# Altium footprint library Library.PcbLib: 224 footprints (part 1 of 16)
Each footprint in its own frame and in the unit in brackets; x right, y up, seen from the top. Pads: shape width x height; smd on the part's side, far side on the other; paste and mask are expansions set on the pad; w line width, h text height; cw(c..) or ccw(c..) is an arc to the next point about the centre after c.
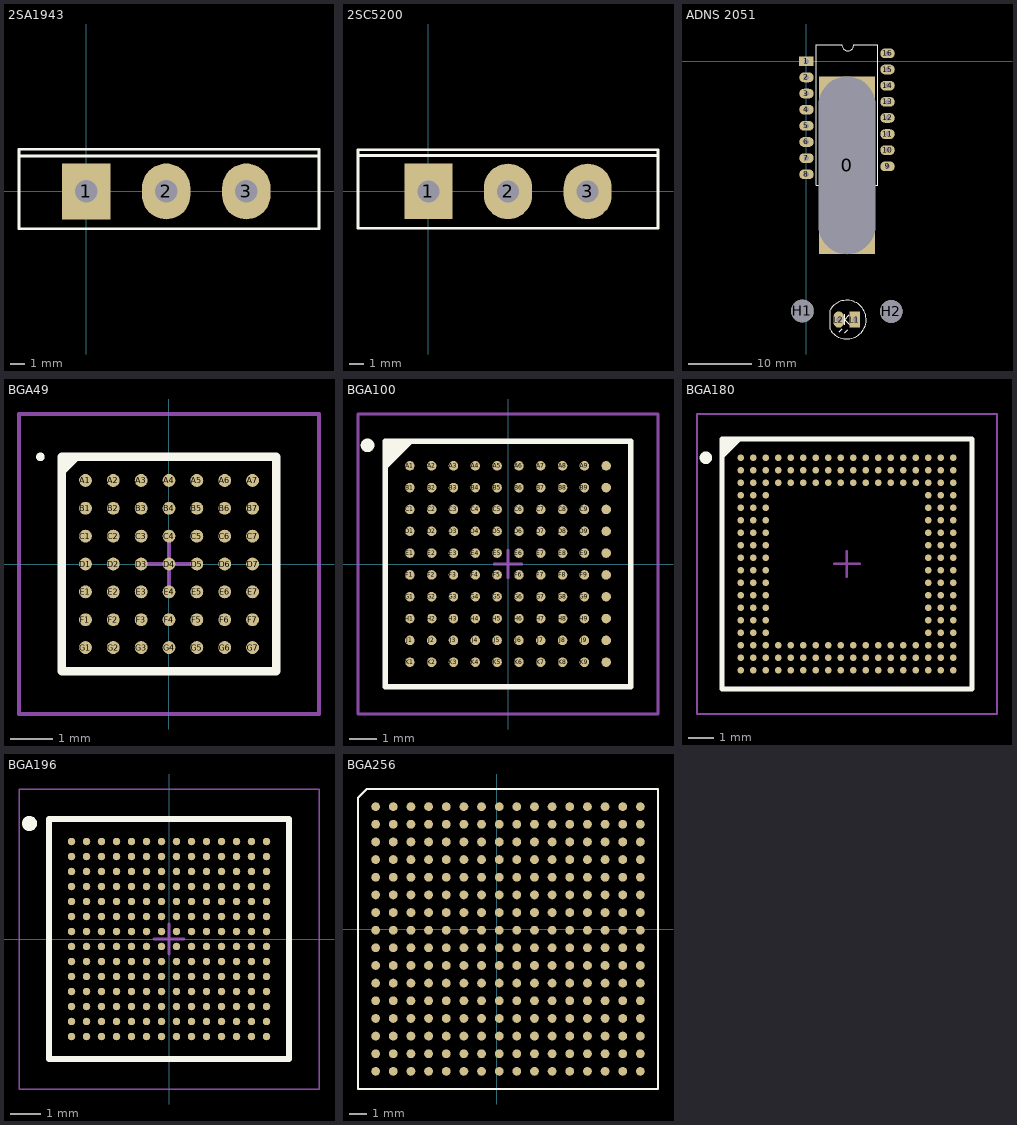
[diagram p0: the footprints below, top view; thin cyan lines are the x and y axes]

## 2SA1943 [mil] "2SA1943"
height 200
pads (3):
  rect 130x150 hole 60: 1(0,0)
  oval 130x150 hole 60: 2(215,0) 3(430,0)
Top Overlay:
  lines w7: -175,95 625,95 ; -180,-100 -180,113 625,113 625,-100 -180,-100
3D body "User Library-2SA1943.step": height 1485.22, standoff -324.98, extent -183.54,-95 623.54,109.72

## 2SC5200 [mil] "2SC5200"
height 200
pads (3):
  rect 130x150 hole 60: 1(0,0)
  oval 130x150 hole 60: 2(215,0) 3(430,0)
Top Overlay:
  lines w7: -190,97 620,97 ; -190,-100 -190,113 620,113 620,-100 -190,-100
3D body "User Library-2SC5200.step": height 1485.22, standoff -324.98, extent -188.54,-94.72 618.54,110

## ADNS 2051 [mil] "Foots pin for Mouse"
pads (21):
  rect 350x1100 hole 350 slot 1100 at 90 deg: 0(251,-645)
  rect 90x60 hole 31: 1(0,0)
  oval 90x60 hole 31: 2(0,-100) 3(0,-200) 4(0,-300) 5(0,-400) 6(0,-500) 7(0,-600) 8(0,-700) 9(502,-651) 10(502,-551) 11(502,-451) 12(502,-351) 13(502,-251) 14(502,-151) 15(502,-51) 16(502,49)
  round 140 hole 140: H1(-25,-1547) H2(525,-1550)
  rect 65x100 hole 32: L1(300,-1600.5)
  oval 65x100 hole 32: L2(200,-1600.5)
Top Overlay:
  lines w7: 146,-1660.5 146,-1541.5 ; 146.06,-1540.53 cw(c250,-1600.5) 146.49,-1661.21 ; 204,-1675.5 221,-1658.5 ; 218,103 59,103 59,-767 443,-767 443,103 296,103 ; 218.97,101 ccw(c255.99,101) 293,101 ; 236,-1632.5 236,-1566.5 ; 238,-1681.5 255,-1664.5 ; 265,-1629.5 236,-1600.5 265,-1571.5 ; 394.94,-516.95 ccw(c252.8,-525.96) 395,-518
  text "ADNS2051" at 108,-229 h40

## BGA49 [mm] "BGA, 49-Leads, Body 5x5mm, Pitch 0.65mm"
height 1
pads (49):
  round 0.3 smd: A1(-1.95,1.95) A2(-1.3,1.95) A3(-0.65,1.95) A4(0,1.95) A5(0.65,1.95) A6(1.3,1.95) A7(1.95,1.95) B1(-1.95,1.3) B2(-1.3,1.3) B3(-0.65,1.3) B4(0,1.3) B5(0.65,1.3) B6(1.3,1.3) B7(1.95,1.3) C1(-1.95,0.65) C2(-1.3,0.65) C3(-0.65,0.65) C4(0,0.65) C5(0.65,0.65) C6(1.3,0.65) C7(1.95,0.65) D1(-1.95,0) D2(-1.3,0) D3(-0.65,0) D4(0,0) D5(0.65,0) D6(1.3,0) D7(1.95,0) E1(-1.95,-0.65) E2(-1.3,-0.65) E3(-0.65,-0.65) E4(0,-0.65) E5(0.65,-0.65) E6(1.3,-0.65) E7(1.95,-0.65) F1(-1.95,-1.3) F2(-1.3,-1.3) F3(-0.65,-1.3) F4(0,-1.3) F5(0.65,-1.3) F6(1.3,-1.3) F7(1.95,-1.3) G1(-1.95,-1.95) G2(-1.3,-1.95) G3(-0.65,-1.95) G4(0,-1.95) G5(0.65,-1.95) G6(1.3,-1.95) G7(1.95,-1.95)
Top Overlay:
  circle w0.1: c-3,2.5 r0.05
  region: -2.178,2.5 -2.5,2.178 -2.5,2.5
  lines w0.2: -2.5,2.178 -2.178,2.5 ; -2.5,-2.5 2.5,-2.5 2.5,2.5 -2.5,2.5 -2.5,-2.5
Mechanical 13:
  lines w0.1: -2.5,-2.5 2.5,-2.5 2.5,2.5 -2.5,2.5 -2.5,-2.5
Mechanical 15:
  lines w0.1: -0.5,0 0.5,0 ; 0,-0.5 0,0.5 ; -3.5,-3.5 3.5,-3.5 3.5,3.5 -3.5,3.5 -3.5,-3.5
3D body "User Library-VFBGA-49.step": height 1, standoff 0.03, extent -2.5,-2.5 2.5,2.5

## BGA100 [mm] "BGA, 100-Leads, Body 9x9mm, Pitch 0.8mm"
height 1.2
pads (100):
  round 0.35 smd: A1(-3.6,3.6) A2(-2.8,3.6) A3(-2,3.6) A4(-1.2,3.6) A5(-0.4,3.6) A6(0.4,3.6) A7(1.2,3.6) A8(2,3.6) A9(2.8,3.6) A10(3.6,3.6) B1(-3.6,2.8) B2(-2.8,2.8) B3(-2,2.8) B4(-1.2,2.8) B5(-0.4,2.8) B6(0.4,2.8) B7(1.2,2.8) B8(2,2.8) B9(2.8,2.8) B10(3.6,2.8) C1(-3.6,2) C2(-2.8,2) C3(-2,2) C4(-1.2,2) C5(-0.4,2) C6(0.4,2) C7(1.2,2) C8(2,2) C9(2.8,2) C10(3.6,2) D1(-3.6,1.2) D2(-2.8,1.2) D3(-2,1.2) D4(-1.2,1.2) D5(-0.4,1.2) D6(0.4,1.2) D7(1.2,1.2) D8(2,1.2) D9(2.8,1.2) D10(3.6,1.2) E1(-3.6,0.4) E2(-2.8,0.4) E3(-2,0.4) E4(-1.2,0.4) E5(-0.4,0.4) E6(0.4,0.4) E7(1.2,0.4) E8(2,0.4) E9(2.8,0.4) E10(3.6,0.4) F1(-3.6,-0.4) F2(-2.8,-0.4) F3(-2,-0.4) F4(-1.2,-0.4) F5(-0.4,-0.4) F6(0.4,-0.4) F7(1.2,-0.4) F8(2,-0.4) F9(2.8,-0.4) F10(3.6,-0.4) G1(-3.6,-1.2) G2(-2.8,-1.2) G3(-2,-1.2) G4(-1.2,-1.2) G5(-0.4,-1.2) G6(0.4,-1.2) G7(1.2,-1.2) G8(2,-1.2) G9(2.8,-1.2) G10(3.6,-1.2) H1(-3.6,-2) H2(-2.8,-2) H3(-2,-2) H4(-1.2,-2) H5(-0.4,-2) H6(0.4,-2) H7(1.2,-2) H8(2,-2) H9(2.8,-2) H10(3.6,-2) J1(-3.6,-2.8) J2(-2.8,-2.8) J3(-2,-2.8) J4(-1.2,-2.8) J5(-0.4,-2.8) J6(0.4,-2.8) J7(1.2,-2.8) J8(2,-2.8) J9(2.8,-2.8) J10(3.6,-2.8) K1(-3.6,-3.6) K2(-2.8,-3.6) K3(-2,-3.6) K4(-1.2,-3.6) K5(-0.4,-3.6) K6(0.4,-3.6) K7(1.2,-3.6) K8(2,-3.6) K9(2.8,-3.6) K10(3.6,-3.6)
Top Overlay:
  circle w0.25: c-5.15,4.35 r0.125
  region: -3.584,4.5 -4.5,3.584 -4.5,4.5
  lines w0.2: -4.5,3.584 -3.584,4.5 ; -4.5,-4.5 4.5,-4.5 4.5,4.5 -4.5,4.5 -4.5,-4.5
Mechanical 13:
  lines w0.1: -4.5,-4.5 4.5,-4.5 4.5,4.5 -4.5,4.5 -4.5,-4.5
Mechanical 15:
  lines w0.1: -0.5,0 0.5,0 ; 0,-0.5 0,0.5 ; -5.5,-5.5 5.5,-5.5 5.5,5.5 -5.5,5.5 -5.5,-5.5
3D body "BGA100C80P10X10_900X900X150.step": height 1.5, standoff 0, extent -4.5,-4.5 4.5,4.5

## BGA180 [mm] "BGA, 180-Leads, Body 10x10mm, Pitch 0.5mm"
height 1.11
pads (180):
  round 0.267 smd paste+0.038 mask+0.038: A1(-17,17) A2(-16.5,17) A3(-16,17) A4(-15.5,17) A5(-15,17) A6(-14.5,17) A7(-14,17) A8(-13.5,17) A9(-13,17) A10(-12.5,17) A11(-12,17) A12(-11.5,17) A13(-11,17) A14(-10.5,17) A15(-10,17) A16(-9.5,17) A17(-9,17) A18(-8.5,17) B1(-17,16.5) B2(-16.5,16.5) B3(-16,16.5) B4(-15.5,16.5) B5(-15,16.5) B6(-14.5,16.5) B7(-14,16.5) B8(-13.5,16.5) B9(-13,16.5) B10(-12.5,16.5) B11(-12,16.5) B12(-11.5,16.5) B13(-11,16.5) B14(-10.5,16.5) B15(-10,16.5) B16(-9.5,16.5) B17(-9,16.5) B18(-8.5,16.5) C1(-17,16) C2(-16.5,16) C3(-16,16) C4(-15.5,16) C5(-15,16) C6(-14.5,16) C7(-14,16) C8(-13.5,16) C9(-13,16) C10(-12.5,16) C11(-12,16) C12(-11.5,16) C13(-11,16) C14(-10.5,16) C15(-10,16) C16(-9.5,16) C17(-9,16) C18(-8.5,16) D1(-17,15.5) D2(-16.5,15.5) D3(-16,15.5) D16(-9.5,15.5) D17(-9,15.5) D18(-8.5,15.5) E1(-17,15) E2(-16.5,15) E3(-16,15) E16(-9.5,15) E17(-9,15) E18(-8.5,15) F1(-17,14.5) F2(-16.5,14.5) F3(-16,14.5) F16(-9.5,14.5) F17(-9,14.5) F18(-8.5,14.5) G1(-17,14) G2(-16.5,14) G3(-16,14) G16(-9.5,14) G17(-9,14) G18(-8.5,14) H1(-17,13.5) H2(-16.5,13.5) H3(-16,13.5) H16(-9.5,13.5) H17(-9,13.5) H18(-8.5,13.5) J1(-17,13) J2(-16.5,13) J3(-16,13) J16(-9.5,13) J17(-9,13) J18(-8.5,13) K1(-17,12.5) K2(-16.5,12.5) K3(-16,12.5) K16(-9.5,12.5) K17(-9,12.5) K18(-8.5,12.5) L1(-17,12) L2(-16.5,12) L3(-16,12) L16(-9.5,12) L17(-9,12) L18(-8.5,12) M1(-17,11.5) M2(-16.5,11.5) M3(-16,11.5) M16(-9.5,11.5) M17(-9,11.5) M18(-8.5,11.5) N1(-17,11) N2(-16.5,11) N3(-16,11) N16(-9.5,11) N17(-9,11) N18(-8.5,11) P1(-17,10.5) P2(-16.5,10.5) P3(-16,10.5) P16(-9.5,10.5) P17(-9,10.5) P18(-8.5,10.5) R1(-17,10) R2(-16.5,10) R3(-16,10) R16(-9.5,10) R17(-9,10) R18(-8.5,10) T1(-17,9.5) T2(-16.5,9.5) T3(-16,9.5) T4(-15.5,9.5) T5(-15,9.5) T6(-14.5,9.5) T7(-14,9.5) T8(-13.5,9.5) T9(-13,9.5) T10(-12.5,9.5) T11(-12,9.5) T12(-11.5,9.5) T13(-11,9.5) T14(-10.5,9.5) T15(-10,9.5) T16(-9.5,9.5) T17(-9,9.5) T18(-8.5,9.5) U1(-17,9) U2(-16.5,9) U3(-16,9) U4(-15.5,9) U5(-15,9) U6(-14.5,9) U7(-14,9) U8(-13.5,9) U9(-13,9) U10(-12.5,9) U11(-12,9) U12(-11.5,9) U13(-11,9) U14(-10.5,9) U15(-10,9) U16(-9.5,9) U17(-9,9) U18(-8.5,9) V1(-17,8.5) V2(-16.5,8.5) V3(-16,8.5) V4(-15.5,8.5) V5(-15,8.5) V6(-14.5,8.5) V7(-14,8.5) V8(-13.5,8.5) V9(-13,8.5) V10(-12.5,8.5) V11(-12,8.5) V12(-11.5,8.5) V13(-11,8.5) V14(-10.5,8.5) V15(-10,8.5) V16(-9.5,8.5) V17(-9,8.5) V18(-8.5,8.5)
Top Overlay:
  circle w0.25: c-18.4,17 r0.125
  region: -17.056,17.75 -17.75,17.056 -17.75,17.75
  lines w0.2: -17.75,17.056 -17.056,17.75 ; -17.75,7.75 -7.75,7.75 -7.75,17.75 -17.75,17.75 -17.75,7.75
Mechanical 13:
  lines w0.1: -17.75,7.75 -7.75,7.75 -7.75,17.75 -17.75,17.75 -17.75,7.75
Mechanical 15:
  lines w0.1: -13.25,12.75 -12.25,12.75 ; -12.75,12.25 -12.75,13.25 ; -18.75,6.75 -6.75,6.75 -6.75,18.75 -18.75,18.75 -18.75,6.75
3D body: height 0.51, standoff 0, extent -17.793,7.734 -7.734,17.793

## BGA196 [mm] "BGA, 196-Leads, Body 8x8mm, Pitch 0.5mm"
height 1.1
pads (196):
  round 0.25 smd: A1(-3.25,3.25) A2(-2.75,3.25) A3(-2.25,3.25) A4(-1.75,3.25) A5(-1.25,3.25) A6(-0.75,3.25) A7(-0.25,3.25) A8(0.25,3.25) A9(0.75,3.25) A10(1.25,3.25) A11(1.75,3.25) A12(2.25,3.25) A13(2.75,3.25) A14(3.25,3.25) B1(-3.25,2.75) B2(-2.75,2.75) B3(-2.25,2.75) B4(-1.75,2.75) B5(-1.25,2.75) B6(-0.75,2.75) B7(-0.25,2.75) B8(0.25,2.75) B9(0.75,2.75) B10(1.25,2.75) B11(1.75,2.75) B12(2.25,2.75) B13(2.75,2.75) B14(3.25,2.75) C1(-3.25,2.25) C2(-2.75,2.25) C3(-2.25,2.25) C4(-1.75,2.25) C5(-1.25,2.25) C6(-0.75,2.25) C7(-0.25,2.25) C8(0.25,2.25) C9(0.75,2.25) C10(1.25,2.25) C11(1.75,2.25) C12(2.25,2.25) C13(2.75,2.25) C14(3.25,2.25) D1(-3.25,1.75) D2(-2.75,1.75) D3(-2.25,1.75) D4(-1.75,1.75) D5(-1.25,1.75) D6(-0.75,1.75) D7(-0.25,1.75) D8(0.25,1.75) D9(0.75,1.75) D10(1.25,1.75) D11(1.75,1.75) D12(2.25,1.75) D13(2.75,1.75) D14(3.25,1.75) E1(-3.25,1.25) E2(-2.75,1.25) E3(-2.25,1.25) E4(-1.75,1.25) E5(-1.25,1.25) E6(-0.75,1.25) E7(-0.25,1.25) E8(0.25,1.25) E9(0.75,1.25) E10(1.25,1.25) E11(1.75,1.25) E12(2.25,1.25) E13(2.75,1.25) E14(3.25,1.25) F1(-3.25,0.75) F2(-2.75,0.75) F3(-2.25,0.75) F4(-1.75,0.75) F5(-1.25,0.75) F6(-0.75,0.75) F7(-0.25,0.75) F8(0.25,0.75) F9(0.75,0.75) F10(1.25,0.75) F11(1.75,0.75) F12(2.25,0.75) F13(2.75,0.75) F14(3.25,0.75) G1(-3.25,0.25) G2(-2.75,0.25) G3(-2.25,0.25) G4(-1.75,0.25) G5(-1.25,0.25) G6(-0.75,0.25) G7(-0.25,0.25) G8(0.25,0.25) G9(0.75,0.25) G10(1.25,0.25) G11(1.75,0.25) G12(2.25,0.25) G13(2.75,0.25) G14(3.25,0.25) H1(-3.25,-0.25) H2(-2.75,-0.25) H3(-2.25,-0.25) H4(-1.75,-0.25) H5(-1.25,-0.25) H6(-0.75,-0.25) H7(-0.25,-0.25) H8(0.25,-0.25) H9(0.75,-0.25) H10(1.25,-0.25) H11(1.75,-0.25) H12(2.25,-0.25) H13(2.75,-0.25) H14(3.25,-0.25) J1(-3.25,-0.75) J2(-2.75,-0.75) J3(-2.25,-0.75) J4(-1.75,-0.75) J5(-1.25,-0.75) J6(-0.75,-0.75) J7(-0.25,-0.75) J8(0.25,-0.75) J9(0.75,-0.75) J10(1.25,-0.75) J11(1.75,-0.75) J12(2.25,-0.75) J13(2.75,-0.75) J14(3.25,-0.75) K1(-3.25,-1.25) K2(-2.75,-1.25) K3(-2.25,-1.25) K4(-1.75,-1.25) K5(-1.25,-1.25) K6(-0.75,-1.25) K7(-0.25,-1.25) K8(0.25,-1.25) K9(0.75,-1.25) K10(1.25,-1.25) K11(1.75,-1.25) K12(2.25,-1.25) K13(2.75,-1.25) K14(3.25,-1.25) L1(-3.25,-1.75) L2(-2.75,-1.75) L3(-2.25,-1.75) L4(-1.75,-1.75) L5(-1.25,-1.75) L6(-0.75,-1.75) L7(-0.25,-1.75) L8(0.25,-1.75) L9(0.75,-1.75) L10(1.25,-1.75) L11(1.75,-1.75) L12(2.25,-1.75) L13(2.75,-1.75) L14(3.25,-1.75) M1(-3.25,-2.25) M2(-2.75,-2.25) M3(-2.25,-2.25) M4(-1.75,-2.25) M5(-1.25,-2.25) M6(-0.75,-2.25) M7(-0.25,-2.25) M8(0.25,-2.25) M9(0.75,-2.25) M10(1.25,-2.25) M11(1.75,-2.25) M12(2.25,-2.25) M13(2.75,-2.25) M14(3.25,-2.25) N1(-3.25,-2.75) N2(-2.75,-2.75) N3(-2.25,-2.75) N4(-1.75,-2.75) N5(-1.25,-2.75) N6(-0.75,-2.75) N7(-0.25,-2.75) N8(0.25,-2.75) N9(0.75,-2.75) N10(1.25,-2.75) N11(1.75,-2.75) N12(2.25,-2.75) N13(2.75,-2.75) N14(3.25,-2.75) P1(-3.25,-3.25) P2(-2.75,-3.25) P3(-2.25,-3.25) P4(-1.75,-3.25) P5(-1.25,-3.25) P6(-0.75,-3.25) P7(-0.25,-3.25) P8(0.25,-3.25) P9(0.75,-3.25) P10(1.25,-3.25) P11(1.75,-3.25) P12(2.25,-3.25) P13(2.75,-3.25) P14(3.25,-3.25)
Top Overlay:
  circle w0.25: c-4.65,3.85 r0.125
  lines w0.2: -4,-4 4,-4 4,4 -4,4 -4,-4
Mechanical 13:
  lines w0.1: -4,-4 4,-4 4,4 -4,4 -4,-4
Mechanical 15:
  lines w0.05: -5,-5 5,-5 5,5 -5,5 -5,-5
  lines w0.1: -0.5,0 0.5,0 ; 0,-0.5 0,0.5
3D body "BGA196C50P14X14_800X800X150.step": height 1.5, standoff 0, extent -4,-4 4,4

## BGA256 [mm]
pads (256):
  round 0.5 smd: A1(-6.857,6.936) A2(-5.857,6.936) A3(-4.857,6.936) A4(-3.857,6.936) A5(-2.857,6.936) A6(-1.857,6.936) A7(-0.857,6.936) A8(0.143,6.936) A9(1.143,6.936) A10(2.143,6.936) A11(3.143,6.936) A12(4.143,6.936) A13(5.143,6.936) A14(6.143,6.936) A15(7.143,6.936) A16(8.143,6.936) B1(-6.857,5.936) B2(-5.857,5.936) B3(-4.857,5.936) B4(-3.857,5.936) B5(-2.857,5.936) B6(-1.857,5.936) B7(-0.857,5.936) B8(0.143,5.936) B9(1.143,5.936) B10(2.143,5.936) B11(3.143,5.936) B12(4.143,5.936) B13(5.143,5.936) B14(6.143,5.936) B15(7.143,5.936) B16(8.143,5.936) C1(-6.857,4.936) C2(-5.857,4.936) C3(-4.857,4.936) C4(-3.857,4.936) C5(-2.857,4.936) C6(-1.857,4.936) C7(-0.857,4.936) C8(0.143,4.936) C9(1.143,4.936) C10(2.143,4.936) C11(3.143,4.936) C12(4.143,4.936) C13(5.143,4.936) C14(6.143,4.936) C15(7.143,4.936) C16(8.143,4.936) D1(-6.857,3.936) D2(-5.857,3.936) D3(-4.857,3.936) D4(-3.857,3.936) D5(-2.857,3.936) D6(-1.857,3.936) D7(-0.857,3.936) D8(0.143,3.936) D9(1.143,3.936) D10(2.143,3.936) D11(3.143,3.936) D12(4.143,3.936) D13(5.143,3.936) D14(6.143,3.936) D15(7.143,3.936) D16(8.143,3.936) E1(-6.857,2.936) E2(-5.857,2.936) E3(-4.857,2.936) E4(-3.857,2.936) E5(-2.857,2.936) E6(-1.857,2.936) E7(-0.857,2.936) E8(0.143,2.936) E9(1.143,2.936) E10(2.143,2.936) E11(3.143,2.936) E12(4.143,2.936) E13(5.143,2.936) E14(6.143,2.936) E15(7.143,2.936) E16(8.143,2.936) F1(-6.857,1.936) F2(-5.857,1.936) F3(-4.857,1.936) F4(-3.857,1.936) F5(-2.857,1.936) F6(-1.857,1.936) F7(-0.857,1.936) F8(0.143,1.936) F9(1.143,1.936) F10(2.143,1.936) F11(3.143,1.936) F12(4.143,1.936) F13(5.143,1.936) F14(6.143,1.936) F15(7.143,1.936) F16(8.143,1.936) G1(-6.857,0.936) G2(-5.857,0.936) G3(-4.857,0.936) G4(-3.857,0.936) G5(-2.857,0.936) G6(-1.857,0.936) G7(-0.857,0.936) G8(0.143,0.936) G9(1.143,0.936) G10(2.143,0.936) G11(3.143,0.936) G12(4.143,0.936) G13(5.143,0.936) G14(6.143,0.936) G15(7.143,0.936) G16(8.143,0.936) H1(-6.857,-0.064) H2(-5.857,-0.064) H3(-4.857,-0.064) H4(-3.857,-0.064) H5(-2.857,-0.064) H6(-1.857,-0.064) H7(-0.857,-0.064) H8(0.143,-0.064) H9(1.143,-0.064) H10(2.143,-0.064) H11(3.143,-0.064) H12(4.143,-0.064) H13(5.143,-0.064) H14(6.143,-0.064) H15(7.143,-0.064) H16(8.143,-0.064) J1(-6.857,-1.064) J2(-5.857,-1.064) J3(-4.857,-1.064) J4(-3.857,-1.064) J5(-2.857,-1.064) J6(-1.857,-1.064) J7(-0.857,-1.064) J8(0.143,-1.064) J9(1.143,-1.064) J10(2.143,-1.064) J11(3.143,-1.064) J12(4.143,-1.064) J13(5.143,-1.064) J14(6.143,-1.064) J15(7.143,-1.064) J16(8.143,-1.064) K1(-6.857,-2.064) K2(-5.857,-2.064) K3(-4.857,-2.064) K4(-3.857,-2.064) K5(-2.857,-2.064) K6(-1.857,-2.064) K7(-0.857,-2.064) K8(0.143,-2.064) K9(1.143,-2.064) K10(2.143,-2.064) K11(3.143,-2.064) K12(4.143,-2.064) K13(5.143,-2.064) K14(6.143,-2.064) K15(7.143,-2.064) K16(8.143,-2.064) L1(-6.857,-3.064) L2(-5.857,-3.064) L3(-4.857,-3.064) L4(-3.857,-3.064) L5(-2.857,-3.064) L6(-1.857,-3.064) L7(-0.857,-3.064) L8(0.143,-3.064) L9(1.143,-3.064) L10(2.143,-3.064) L11(3.143,-3.064) L12(4.143,-3.064) L13(5.143,-3.064) L14(6.143,-3.064) L15(7.143,-3.064) L16(8.143,-3.064) M1(-6.857,-4.064) M2(-5.857,-4.064) M3(-4.857,-4.064) M4(-3.857,-4.064) M5(-2.857,-4.064) M6(-1.857,-4.064) M7(-0.857,-4.064) M8(0.143,-4.064) M9(1.143,-4.064) M10(2.143,-4.064) M11(3.143,-4.064) M12(4.143,-4.064) M13(5.143,-4.064) M14(6.143,-4.064) M15(7.143,-4.064) M16(8.143,-4.064) N1(-6.857,-5.064) N2(-5.857,-5.064) N3(-4.857,-5.064) N4(-3.857,-5.064) N5(-2.857,-5.064) N6(-1.857,-5.064) N7(-0.857,-5.064) N8(0.143,-5.064) N9(1.143,-5.064) N10(2.143,-5.064) N11(3.143,-5.064) N12(4.143,-5.064) N13(5.143,-5.064) N14(6.143,-5.064) N15(7.143,-5.064) N16(8.143,-5.064) P1(-6.857,-6.064) P2(-5.857,-6.064) P3(-4.857,-6.064) P4(-3.857,-6.064) P5(-2.857,-6.064) P6(-1.857,-6.064) P7(-0.857,-6.064) P8(0.143,-6.064) P9(1.143,-6.064) P10(2.143,-6.064) P11(3.143,-6.064) P12(4.143,-6.064) P13(5.143,-6.064) P14(6.143,-6.064) P15(7.143,-6.064) P16(8.143,-6.064) R1(-6.857,-7.064) R2(-5.857,-7.064) R3(-4.857,-7.064) R4(-3.857,-7.064) R5(-2.857,-7.064) R6(-1.857,-7.064) R7(-0.857,-7.064) R8(0.143,-7.064) R9(1.143,-7.064) R10(2.143,-7.064) R11(3.143,-7.064) R12(4.143,-7.064) R13(5.143,-7.064) R14(6.143,-7.064) R15(7.143,-7.064) R16(8.143,-7.064) T1(-6.857,-8.064) T2(-5.857,-8.064) T3(-4.857,-8.064) T4(-3.857,-8.064) T5(-2.857,-8.064) T6(-1.857,-8.064) T7(-0.857,-8.064) T8(0.143,-8.064) T9(1.143,-8.064) T10(2.143,-8.064) T11(3.143,-8.064) T12(4.143,-8.064) T13(5.143,-8.064) T14(6.143,-8.064) T15(7.143,-8.064) T16(8.143,-8.064)
Top Overlay:
  lines w0.127: -7.857,-9.064 -7.857,7.436 -7.357,7.936 9.143,7.936 9.143,-9.064 -7.857,-9.064
3D body "User Library-BGA 256 17x17mm 1mm pitch.step": height 1.5, standoff -0.25, extent -7.865,-9.017 9.135,7.983